# Altium footprint library PCB_GENERAL.PcbLib: 226 footprints (part 5 of 15)
Each footprint in its own frame and in the unit in brackets; x right, y up, seen from the top. Pads: shape width x height; smd on the part's side, far side on the other; paste and mask are expansions set on the pad; w line width, h text height; cw(c..) or ccw(c..) is an arc to the next point about the centre after c.
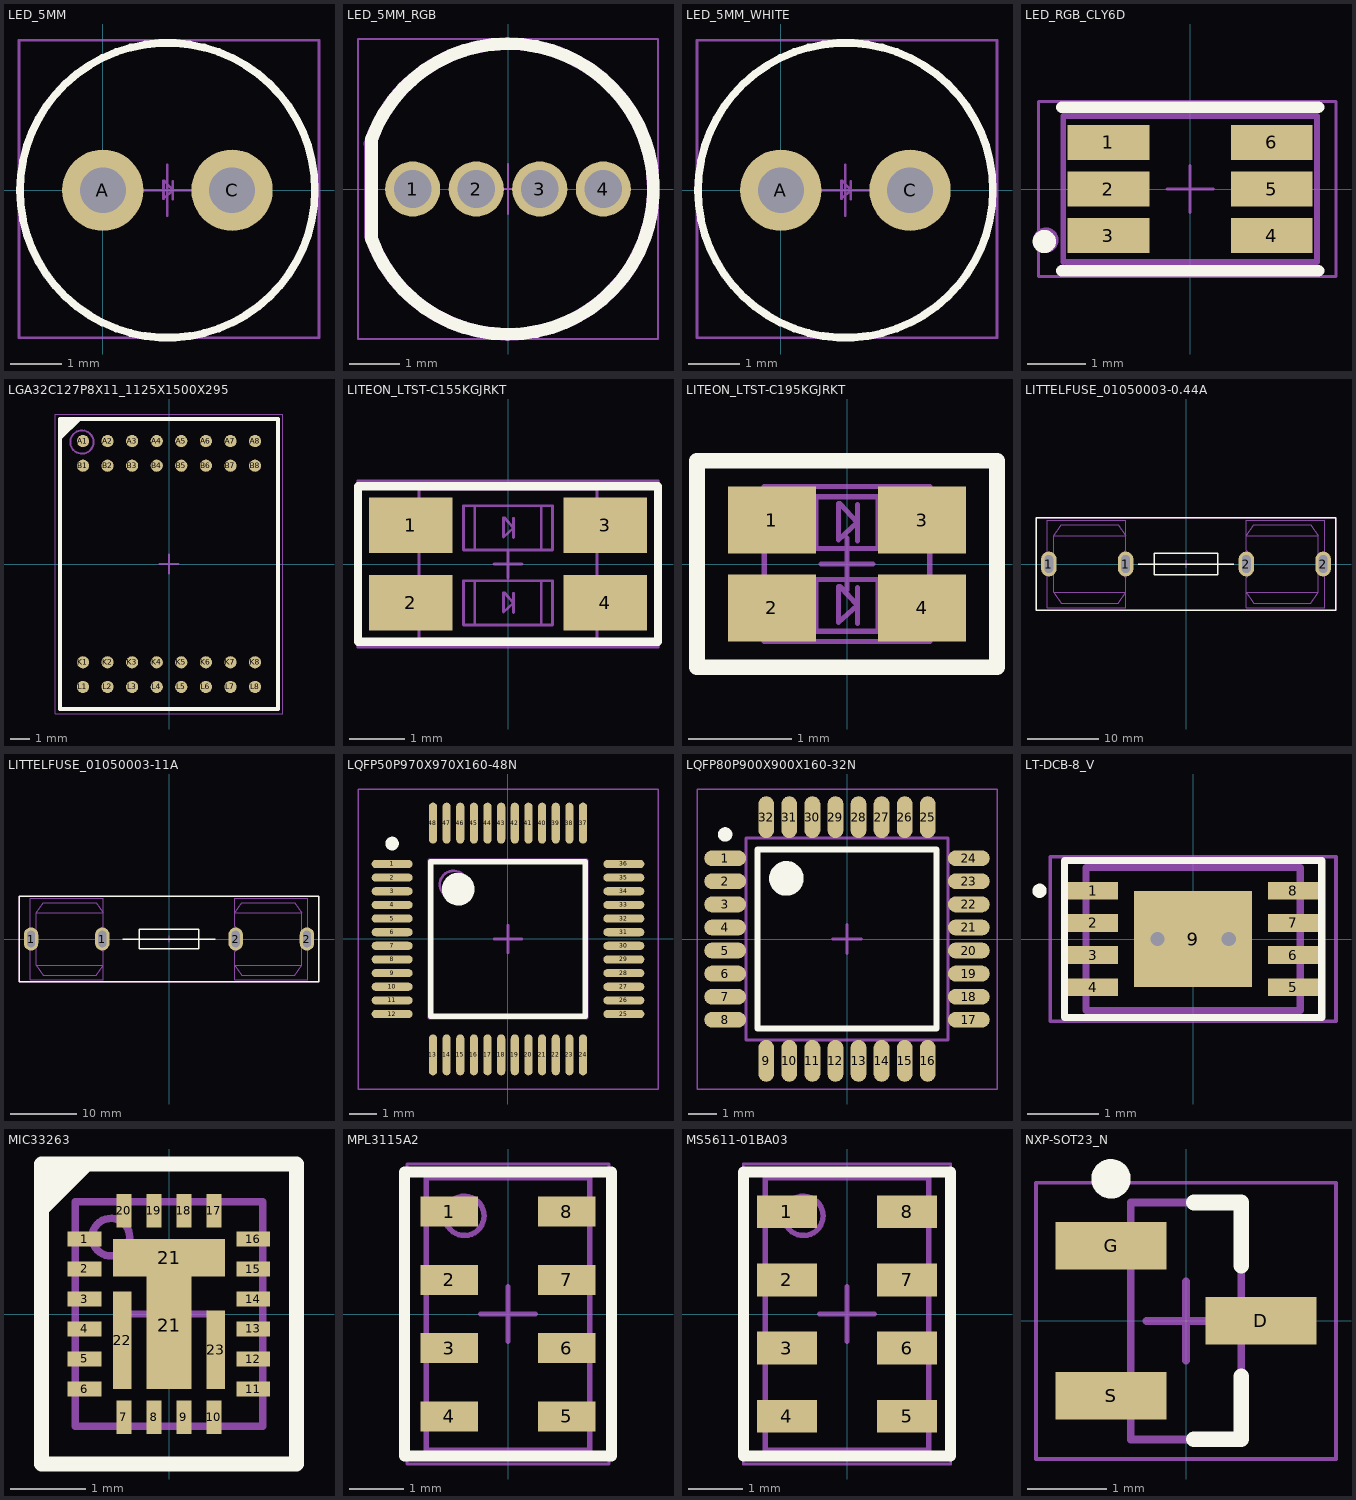
[diagram p4: the footprints below, top view; thin cyan lines are the x and y axes]

## LED_5MM [mm] "LED; 2 Leads"
pads (2):
  round 1.6 hole 0.9: A(0,0) C(2.54,0)
Top Overlay:
  circle w0.15: c1.27,0 r2.9
Mechanical 11:
  text ".Designator" at -0.55,1.1 h0.3
Mechanical 14:
  circle w0.1: c1.27,0 r2.9
  lines w0.05: 1.192,0.183 1.192,-0.166 1.375,0 1.209,0.183 ; 1.375,-0.175 1.375,0.174
Mechanical 15:
  lines w0.05: 0.77,0 1.77,0 ; 1.27,-0.5 1.27,0.5 ; -1.65,-2.9 -1.65,2.95 4.25,2.95 4.25,-2.9 -1.65,-2.9
3D body "User Library-LED5MM.STEP": height 9.1, standoff -6.5, extent -1.65,-2.942 4.25,2.942

## LED_5MM_RGB [mm] "LED; 2 Leads"
pads (4):
  round 1.1 hole 0.75: 1(-1.905,0) 2(-0.635,0) 3(0.635,0) 4(1.905,0)
Top Overlay:
  lines w0.254: -2.732,-0.993 ccw(c0,0) -2.732,0.993 -2.732,-0.993
Mechanical 11:
  text ".Designator" at -2.455,1.1 h0.3
Mechanical 14:
  lines w0.254: -2.763,0.903 cw(c0,0) -2.758,-0.919 ; -2.752,-0.919 -2.752,0.9
Mechanical 15:
  lines w0.05: -0.5,0 0.5,0 ; 0,-0.5 0,0.5 ; -3,-3 -3,3 3,3 3,-3 -3,-3
3D body "WP154A4.STEP": height 8.6, standoff -24.5, extent -2.525,-2.95 2.925,2.95

## LED_5MM_WHITE [mm] "LED; 2 Leads"
pads (2):
  round 1.6 hole 0.9: A(0,0) C(2.54,0)
Top Overlay:
  circle w0.15: c1.27,0 r2.9
Mechanical 11:
  text ".Designator" at -0.55,1.1 h0.3
Mechanical 14:
  circle w0.1: c1.27,0 r2.9
  lines w0.05: 1.192,0.183 1.192,-0.166 1.375,0 1.209,0.183 ; 1.375,-0.175 1.375,0.174
Mechanical 15:
  lines w0.05: 0.77,0 1.77,0 ; 1.27,-0.5 1.27,0.5 ; -1.65,-2.9 -1.65,2.95 4.25,2.95 4.25,-2.9 -1.65,-2.9
3D body "User Library-White LED 5mm Straight.step": height 8.5, standoff -27.5, extent -1.6,-2.9 4.2,2.9

## LED_RGB_CLY6D [mm]
pads (6):
  rect 1.4x0.6 smd: 1(-1.4,0.8) 2(-1.4,0) 3(-1.4,-0.8) 4(1.4,-0.8) 5(1.4,0) 6(1.4,0.8)
Top Overlay:
  circle w0.2: c-2.5,-0.9 r0.1
  lines w0.2: -2.2,-1.4 2.2,-1.4 ; -2.2,1.4 2.2,1.4
Mechanical 11:
  text ".Designator" at -1.8,3.725 h0.76
Mechanical 14:
  circle w0.1: c-2.475,-0.875 r0.168
  lines w0.1: -2.175,-1.25 -2.175,-0.8 -2.175,0.8 -2.175,1.25 ; -2.15,1.25 -1.075,1.25 1.075,1.25 2.15,1.25 ; -2.125,-1.25 2.175,-1.25 2.175,-0.8 2.175,0.8 2.175,1.25
Mechanical 15:
  lines w0.05: -0.4,0 0.4,0 ; 0,-0.4 0,0.4 ; -2.6,-1.5 2.5,-1.5 2.5,1.5 -2.6,1.5 -2.6,-1.5

## LGA32C127P8X11_1125X1500X295 [mm] "LGA, 32-Leads, Body 11,25x15,00mmx2,95mm, Pitch 1,27mm"
height 2.95
pads (32):
  round 0.63 smd: A1(-4.445,6.35) A2(-3.175,6.35) A3(-1.905,6.35) A4(-0.635,6.35) A5(0.635,6.35) A6(1.905,6.35) A7(3.175,6.35) A8(4.445,6.35) B1(-4.445,5.08) B2(-3.175,5.08) B3(-1.905,5.08) B4(-0.635,5.08) B5(0.635,5.08) B6(1.905,5.08) B7(3.175,5.08) B8(4.445,5.08) K1(-4.445,-5.08) K2(-3.175,-5.08) K3(-1.905,-5.08) K4(-0.635,-5.08) K5(0.635,-5.08) K6(1.905,-5.08) K7(3.175,-5.08) K8(4.445,-5.08) L1(-4.445,-6.35) L2(-3.175,-6.35) L3(-1.905,-6.35) L4(-0.635,-6.35) L5(0.635,-6.35) L6(1.905,-6.35) L7(3.175,-6.35) L8(4.445,-6.35)
Top Overlay:
  region: -4.625,7.5 -5.625,6.5 -5.625,7.5
  lines w0.2: -5.625,6.5 -4.625,7.5 ; -5.625,-7.5 5.625,-7.5 5.625,7.5 -5.625,7.5 -5.625,-7.5
Mechanical 11:
  text ".Designator" at -4.5,0 h1
Mechanical 14:
  circle w0.1: c-4.5,6.3 r0.6
  lines w0.1: -5.625,-7.5 5.625,-7.5 5.625,7.5 -5.625,7.5 -5.625,-7.5
Mechanical 15:
  lines w0.05: -5.875,-7.75 5.875,-7.75 5.875,7.75 -5.875,7.75 -5.875,-7.75
  lines w0.1: -0.5,0 0.5,0 ; 0,-0.5 0,0.5
3D body: height 2.95, standoff 0, extent -5.625,-7.5 5.625,7.5

## LITEON_LTST-C155KGJRKT [mm] "LED,  4-Leads"
height 1.1
pads (4):
  rect 1.5x1 smd mask+0.05: 1(-1.75,0.7) 2(-1.75,-0.7) 3(1.75,0.7) 4(1.75,-0.7)
Top Overlay:
  lines w0.15: -2.7,-1.4 -2.7,1.4 2.7,1.4 2.7,-1.4 -2.7,-1.4
Mechanical 11:
  text ".Designator" at -1.3,-0.1 h0.3
Mechanical 14:
  lines w0.05: -0.6,-1.1 -0.6,-0.3 ; -0.6,0.25 -0.6,1.05 ; -0.083,-0.517 -0.083,-0.866 0.1,-0.7 -0.066,-0.517 ; -0.083,0.833 -0.083,0.484 0.1,0.65 -0.066,0.833 ; 0.1,-0.875 0.1,-0.526 ; 0.1,0.475 0.1,0.824 ; 0.6,-1.1 0.6,-0.3 ; 0.6,0.25 0.6,1.05 ; -1.6,-1.35 1.6,-1.35 1.6,1.35 -1.6,1.35 -1.6,-1.35 ; -0.8,-1.1 -0.8,-0.3 0.8,-0.3 0.8,-1.1 -0.8,-1.1 ; -0.8,0.25 -0.8,1.05 0.8,1.05 0.8,0.25 -0.8,0.25
Mechanical 15:
  lines w0.05: -0.25,0 0.25,0 ; 0,-0.25 0,0.25 ; -2.7,-1.5 -2.7,1.5 2.7,1.5 2.7,-1.5 -2.7,-1.5

## LITEON_LTST-C195KGJRKT [mm] "LED,  4-Leads"
height 0.55
pads (4):
  rect 0.85x0.65 smd mask+0.05: 1(-0.725,0.425) 2(-0.725,-0.425) 3(0.725,0.425) 4(0.725,-0.425)
Top Overlay:
  lines w0.15: -1.45,-1 -1.45,1 1.45,1 1.45,-1 -1.45,-1
Mechanical 11:
  text ".Designator" at -1.3,-0.1 h0.3
Mechanical 14:
  lines w0.05: -0.3,-0.65 -0.3,-0.15 ; -0.3,0.15 -0.3,0.65 ; -0.083,-0.217 -0.083,-0.566 0.1,-0.4 -0.066,-0.217 ; -0.083,0.583 -0.083,0.234 0.1,0.4 -0.066,0.583 ; 0.1,-0.575 0.1,-0.226 ; 0.1,0.225 0.1,0.574 ; 0.3,-0.65 0.3,-0.15 ; 0.3,0.15 0.3,0.65 ; -0.8,-0.75 0.8,-0.75 0.8,0.75 -0.8,0.75 -0.8,-0.75 ; -0.5,-0.65 0.5,-0.65 0.5,-0.15 -0.5,-0.15 -0.5,-0.65 ; -0.5,0.15 0.5,0.15 0.5,0.65 -0.5,0.65 -0.5,0.15
Mechanical 15:
  lines w0.05: -0.25,0 0.25,0 ; 0,-0.25 0,0.25 ; -1.4,-1 -1.4,1 1.4,1 1.4,-1 -1.4,-1

## LITTELFUSE_01050003-0.44A [mm] "Midget fuseholder 0.44A"
height 18.5
pads (4):
  oval 2.2x3.5 hole 1.2 slot 2.5 at 90 deg: 1(-19.292,0) 1(-8.492,0) 2(8.493,0) 2(19.293,0)
Top Overlay:
  lines w0.2: -6.7,0 6.7,0 ; -21.092,-6.5 -21.092,6.5 21.093,6.5 21.093,-6.5 -21.092,-6.5 ; -4.5,-1.5 -4.5,0 -4.5,1.5 4.5,1.5 4.5,0 4.5,-1.5 -4.5,-1.5
Mechanical 11:
  text ".Designator" at -5.1,-2.8 h1
Mechanical 14:
  lines w0.1: -19.5,-1.12 -19.5,-6.18 -8.452,-6.18 -8.452,-4 ; -19.5,1.12 -19.5,6.18 -8.452,6.18 -8.452,4 ; 19.5,-1.12 19.5,-6.18 8.452,-6.18 8.452,-4 ; 19.5,1.12 19.5,6.18 8.452,6.18 8.452,4 ; -18.62,-4 -18.62,-1.12 -19.78,-1.12 -19.78,0 -19.78,1.12 -18.62,1.12 -18.62,4 ; -18.62,-4 -17.54,-5.5 -9.532,-5.5 -8.452,-4 ; -18.62,-4 -8.452,-4 ; -18.62,4 -8.452,4 ; -18.62,4 -17.54,5.5 -9.532,5.5 -8.452,4 ; -8.452,-4 -8.452,-2.548 -8.452,-1.948 -9.28,-1.12 -8.12,-1.12 -8.12,0 -8.12,1.12 -9.28,1.12 -8.452,1.948 -8.452,2.548 -8.452,4 ; 8.452,-4 8.452,-2.548 8.452,-1.948 9.28,-1.12 8.12,-1.12 8.12,0 8.12,1.12 9.28,1.12 8.452,1.948 8.452,2.548 8.452,4 ; 8.452,-4 18.62,-4 ; 8.452,-4 9.532,-5.5 17.54,-5.5 18.62,-4 ; 8.452,4 9.532,5.5 17.54,5.5 18.62,4 ; 8.452,4 18.62,4 ; 18.62,-4 18.62,-1.12 19.78,-1.12 19.78,0 19.78,1.12 18.62,1.12 18.62,4
Mechanical 15:
  lines w0.05: -21.1,-6.5 -21.1,6.5 21.1,6.5 21.1,-6.5 -21.1,-6.5
  lines w0.1: -0.5,0 0.5,0 ; 0,-0.5 0,0.5
3D body "01050003H_fuse_clip.stp": height 18.49, standoff -2.74, extent 8.15,-6.249 19.65,6.249
3D body "01050003H_fuse_clip.stp": height 18.49, standoff -2.74, extent -19.65,-6.249 -8.15,6.249

## LITTELFUSE_01050003-11A [mm] "Midget fuseholder"
height 18.5
pads (4):
  oval 2.2x3.5 hole 1.2 slot 2.5 at 90 deg: 1(-20.88,0) 1(-10.08,0) 2(10.08,0) 2(20.88,0)
Top Overlay:
  lines w0.2: -7,0 7,0 ; -22.68,-6.5 -22.68,6.5 22.68,6.5 22.68,-6.5 -22.68,-6.5 ; -4.5,-1.5 -4.5,0 -4.5,1.5 4.5,1.5 4.5,0 4.5,-1.5 -4.5,-1.5
Mechanical 11:
  text ".Designator" at -4.6,-2.8 h1
Mechanical 14:
  lines w0.1: -21,-1.12 -21,-6.18 -9.952,-6.18 -9.952,-4 ; -21,1.12 -21,6.18 -9.952,6.18 -9.952,4 ; 21,-1.12 21,-6.18 9.952,-6.18 9.952,-4 ; 21,1.12 21,6.18 9.952,6.18 9.952,4 ; -20.12,-4 -20.12,-1.12 -21.28,-1.12 -21.28,0 -21.28,1.12 -20.12,1.12 -20.12,4 ; -20.12,-4 -19.04,-5.5 -11.032,-5.5 -9.952,-4 ; -20.12,-4 -9.952,-4 ; -20.12,4 -9.952,4 ; -20.12,4 -19.04,5.5 -11.032,5.5 -9.952,4 ; -9.952,-4 -9.952,-2.548 -9.952,-1.948 -10.78,-1.12 -9.62,-1.12 -9.62,0 -9.62,1.12 -10.78,1.12 -9.952,1.948 -9.952,2.548 -9.952,4 ; 9.952,-4 9.952,-2.548 9.952,-1.948 10.78,-1.12 9.62,-1.12 9.62,0 9.62,1.12 10.78,1.12 9.952,1.948 9.952,2.548 9.952,4 ; 9.952,-4 20.12,-4 ; 9.952,-4 11.032,-5.5 19.04,-5.5 20.12,-4 ; 9.952,4 11.032,5.5 19.04,5.5 20.12,4 ; 9.952,4 20.12,4 ; 20.12,-4 20.12,-1.12 21.28,-1.12 21.28,0 21.28,1.12 20.12,1.12 20.12,4
Mechanical 15:
  lines w0.05: -22.7,-6.5 -22.7,6.5 22.7,6.5 22.7,-6.5 -22.7,-6.5
  lines w0.1: -0.5,0 0.5,0 ; 0,-0.5 0,0.5
3D body "01050003H_fuse_clip.stp": height 18.49, standoff -2.74, extent -21.237,-6.249 -9.737,6.249
3D body "01050003H_fuse_clip.stp": height 18.49, standoff -2.74, extent 9.737,-6.249 21.237,6.249

## LQFP50P970X970X160-48N [mm] "LQFP, 48-Leads, Body 5,80x5,80mm, Pitch 0,50mm, IPC Medium Density"
height 1.6
pads (48):
  oval 1.5x0.3 smd: 1(-4.25,2.75) 2(-4.25,2.25) 3(-4.25,1.75) 4(-4.25,1.25) 5(-4.25,0.75) 6(-4.25,0.25) 7(-4.25,-0.25) 8(-4.25,-0.75) 9(-4.25,-1.25) 10(-4.25,-1.75) 11(-4.25,-2.25) 12(-4.25,-2.75) 25(4.25,-2.75) 26(4.25,-2.25) 27(4.25,-1.75) 28(4.25,-1.25) 29(4.25,-0.75) 30(4.25,-0.25) 31(4.25,0.25) 32(4.25,0.75) 33(4.25,1.25) 34(4.25,1.75) 35(4.25,2.25) 36(4.25,2.75)
  oval 0.3x1.5 smd: 13(-2.75,-4.25) 14(-2.25,-4.25) 15(-1.75,-4.25) 16(-1.25,-4.25) 17(-0.75,-4.25) 18(-0.25,-4.25) 19(0.25,-4.25) 20(0.75,-4.25) 21(1.25,-4.25) 22(1.75,-4.25) 23(2.25,-4.25) 24(2.75,-4.25) 37(2.75,4.25) 38(2.25,4.25) 39(1.75,4.25) 40(1.25,4.25) 41(0.75,4.25) 42(0.25,4.25) 43(-0.25,4.25) 44(-0.75,4.25) 45(-1.25,4.25) 46(-1.75,4.25) 47(-2.25,4.25) 48(-2.75,4.25)
Top Overlay:
  circle w0.25: c-4.25,3.5 r0.125
  circle w0.6: c-1.825,1.825 r0.3
  lines w0.2: -2.825,-2.825 -2.825,2.825 2.825,2.825 2.825,-2.825 -2.825,-2.825
Mechanical 13:
  circle w0.1: c-2,2 r0.5
  lines w0.1: -2.9,-2.9 -2.9,2.9 2.9,2.9 2.9,-2.9 -2.9,-2.9
Mechanical 15:
  lines w0.05: -5.5,-5.5 -5.5,5.5 5.5,5.5 5.5,-5.5 -5.5,-5.5
  lines w0.1: -0.5,0 0.5,0 ; 0,-0.5 0,0.5
3D body: height 1.6, standoff 0.15, extent -2.9,-2.9 2.9,2.9

## LQFP80P900X900X160-32N [mm] "LQFP, 32-Leads, Body 7,00x7,00mm, Pitch 0,80mm, IPC Medium Density"
height 1.6
pads (32):
  oval 1.45x0.55 smd: 1(-4.225,2.8) 2(-4.225,2) 3(-4.225,1.2) 4(-4.225,0.4) 5(-4.225,-0.4) 6(-4.225,-1.2) 7(-4.225,-2) 8(-4.225,-2.8) 17(4.225,-2.8) 18(4.225,-2) 19(4.225,-1.2) 20(4.225,-0.4) 21(4.225,0.4) 22(4.225,1.2) 23(4.225,2) 24(4.225,2.8)
  oval 0.55x1.45 smd: 9(-2.8,-4.225) 10(-2,-4.225) 11(-1.2,-4.225) 12(-0.4,-4.225) 13(0.4,-4.225) 14(1.2,-4.225) 15(2,-4.225) 16(2.8,-4.225) 25(2.8,4.225) 26(2,4.225) 27(1.2,4.225) 28(0.4,4.225) 29(-0.4,4.225) 30(-1.2,4.225) 31(-2,4.225) 32(-2.8,4.225)
Top Overlay:
  circle w0.25: c-4.225,3.625 r0.125
  circle w0.6: c-2.1,2.1 r0.3
  lines w0.2: -3.1,-3.1 -3.1,3.1 3.1,3.1 3.1,-3.1 -3.1,-3.1
Mechanical 11:
  text ".Designator" at 0.075,5.775 h0.76
Mechanical 14:
  circle w0.1: c-2.1,2.1 r0.5
  lines w0.1: -3.5,-3.5 -3.5,3.5 3.5,3.5 3.5,-3.5 -3.5,-3.5
Mechanical 15:
  lines w0.05: -5.2,-5.2 -5.2,5.2 5.2,5.2 5.2,-5.2 -5.2,-5.2
  lines w0.1: -0.5,0 0.5,0 ; 0,-0.5 0,0.5
3D body: height 1.6, standoff 0.15, extent -3.5,-3.5 3.5,3.5

## LT-DCB-8_V [mm] "SON, 8-Leads, Body 3x2mm, Pitch 0.45mm, Thermal Pad 1.65x1.35mm"
height 0.8
pads (9):
  rect 0.7x0.25 smd mask+0.102: 1(-1.4,0.675) 2(-1.4,0.225) 3(-1.4,-0.225) 4(-1.4,-0.675) 5(1.4,-0.675) 6(1.4,-0.225) 7(1.4,0.225) 8(1.4,0.675)
  rect 1.65x1.35 smd mask+0.102: 9(0,0)
via 0.5,0 diameter 0.5 hole 0.2
via -0.5,0 diameter 0.5 hole 0.2
Top Overlay:
  circle w0.1: c-2.15,0.675 r0.05
  lines w0.1: -1.8,-1.1 -1.8,1.1 1.8,1.1 1.8,-1.1 -1.8,-1.1
Mechanical 11:
  text ".Designator" at -1.375,1.5 h0.76
Mechanical 14:
  lines w0.1: -1.5,-1 -1.5,1 1.5,1 1.5,-1 -1.5,-1
Mechanical 15:
  lines w0.05: -2,-1.15 2,-1.15 2,1.15 -2,1.15 -2,-1.15
  lines w0.1: -0.5,0 0.5,0 ; 0,-0.5 0,0.5
3D body: height 0.8, standoff 0, extent -1.5,-1 1.5,1

## MIC33263 [mm]
pads (24):
  rect 0.45x0.2 smd: 1(-1.125,1) 2(-1.125,0.6) 3(-1.125,0.2) 4(-1.125,-0.2) 5(-1.125,-0.6) 6(-1.125,-1) 11(1.125,-1) 12(1.125,-0.6) 13(1.125,-0.2) 14(1.125,0.2) 15(1.125,0.6) 16(1.125,1)
  rect 0.2x0.45 smd: 7(-0.6,-1.375) 8(-0.2,-1.375) 9(0.2,-1.375) 10(0.6,-1.375) 17(0.6,1.375) 18(0.2,1.375) 19(-0.2,1.375) 20(-0.6,1.375)
  rect 0.6x1.7 smd: 21(0,-0.15)
  rect 1.5x0.5 smd: 21(0,0.75)
  rect 0.25x1.3 smd: 22(-0.625,-0.35)
  rect 0.25x1.05 smd: 23(0.625,-0.475)
Top Overlay:
  lines w0.1: -1.7,1.325 -1.025,2
  lines w0.2: -1.4,2 -1.7,1.7 ; -1.2,2 -1.325,1.875 -1.575,1.625 ; -1.7,1.5 -1.7,1.5 ; -1.7,1.5 -1.575,1.625 ; -1.7,1.7 -1.7,1.7 ; -1.575,1.625 -1.575,1.625 ; -1.7,-2 -1.7,2 1.7,2 1.7,-2 -1.7,-2
Mechanical 11:
  text ".Designator" at -1.825,2.55 h1
Mechanical 14:
  circle w0.1: c-0.775,1.025 r0.25
  lines w0.1: -1.25,-1.5 1.25,-1.5 1.25,1.5 -1.25,1.5 -1.25,-1.5
Mechanical 15:
  lines w0.05: -1.7,-2 -1.7,2 1.7,2 1.7,-2 -1.7,-2
  lines w0.1: -0.5,0 0.5,0 ; 0,-0.5 0,0.5
3D body: height 1.85, standoff 0, extent -1.25,-1.5 1.25,1.5

## MPL3115A2 [mm]
height 1.2
pads (8):
  rect 1.05x0.55 smd: 1(-1.075,1.875) 2(-1.075,0.625) 3(-1.075,-0.625) 4(-1.075,-1.875) 5(1.075,-1.875) 6(1.075,-0.625) 7(1.075,0.625) 8(1.075,1.875)
Top Overlay:
  lines w0.2: -1.9,-2.6 -1.9,2.6 1.9,2.6 1.9,-2.6 0,-2.6 -1.9,-2.6
Mechanical 11:
  text ".Designator" at -0.5,-0.575 h1
Mechanical 14:
  circle w0.1: c-0.8,1.8 r0.361
  lines w0.1: -1.5,-2.5 -1.5,2.5 1.5,2.5 1.5,-2.5 -1.5,-2.5
Mechanical 15:
  lines w0.05: -1.85,-2.75 -1.85,-0.05 -1.85,2.75 0,2.75 1.85,2.75 1.85,-0.05 1.85,-2.75 0,-2.75 -1.85,-2.75
  lines w0.1: -0.5,0 0,0 ; 0,-0.5 0,0 ; 0,0.5 0,0 ; 0.5,0 0,0
3D body: height 1.2, standoff 0, extent -1.5,-2.5 1.5,2.5

## MS5611-01BA03 [mm]
height 1
pads (8):
  rect 1.1x0.6 smd: 1(-1.1,1.875) 2(-1.1,0.625) 3(-1.1,-0.625) 4(-1.1,-1.875) 5(1.1,-1.875) 6(1.1,-0.625) 7(1.1,0.625) 8(1.1,1.875)
Top Overlay:
  lines w0.2: -1.9,-2.6 -1.9,2.6 1.9,2.6 1.9,-2.6 0,-2.6 -1.9,-2.6
Mechanical 11:
  text ".Designator" at -0.5,-0.575 h1
Mechanical 14:
  circle w0.1: c-0.8,1.8 r0.361
  lines w0.1: -1.5,-2.5 -1.5,2.5 1.5,2.5 1.5,-2.5 -1.5,-2.5
Mechanical 15:
  lines w0.05: -1.9,-2.75 -1.9,0 -1.9,2.75 0,2.75 1.9,2.75 1.9,0 1.9,-2.75 0,-2.75 -1.9,-2.75
  lines w0.1: -0.5,0 0,0 ; 0,-0.5 0,0 ; 0,0.5 0,0 ; 0.5,0 0,0
3D body: height 1, standoff 0, extent -1.5,-2.5 1.5,2.5

## NXP-SOT23_N [mm] "SOT23, 3-Leads, Body 3x1.4mm, Pitch 0.95mm, IPC Medium Density"
height 1.1
pads (3):
  rect 1.4x0.6 smd: D(0.95,0) G(-0.95,0.95) S(-0.95,-0.95)
Top Overlay:
  circle w0.25: c-0.95,1.8 r0.125
  lines w0.2: 0.1,-1.5 0.7,-1.5 0.7,-0.7 ; 0.1,1.5 0.7,1.5 0.7,0.7
Mechanical 13:
  lines w0.1: -0.7,-1.5 0.7,-1.5 0.7,1.5 -0.7,1.5 -0.7,-1.5
Mechanical 15:
  lines w0.05: -1.9,-1.75 1.9,-1.75 1.9,1.75 -1.9,1.75 -1.9,-1.75
  lines w0.1: -0.5,0 0.5,0 ; 0,-0.5 0,0.5
3D body: height 1.1, standoff 0, extent -0.7,-1.5 0.7,1.5